# Altium footprint library UWRT Footprint Library.PcbLib: 258 footprints (part 9 of 17)
Each footprint in its own frame and in the unit in brackets; x right, y up, seen from the top. Pads: shape width x height; smd on the part's side, far side on the other; paste and mask are expansions set on the pad; w line width, h text height; cw(c..) or ccw(c..) is an arc to the next point about the centre after c.
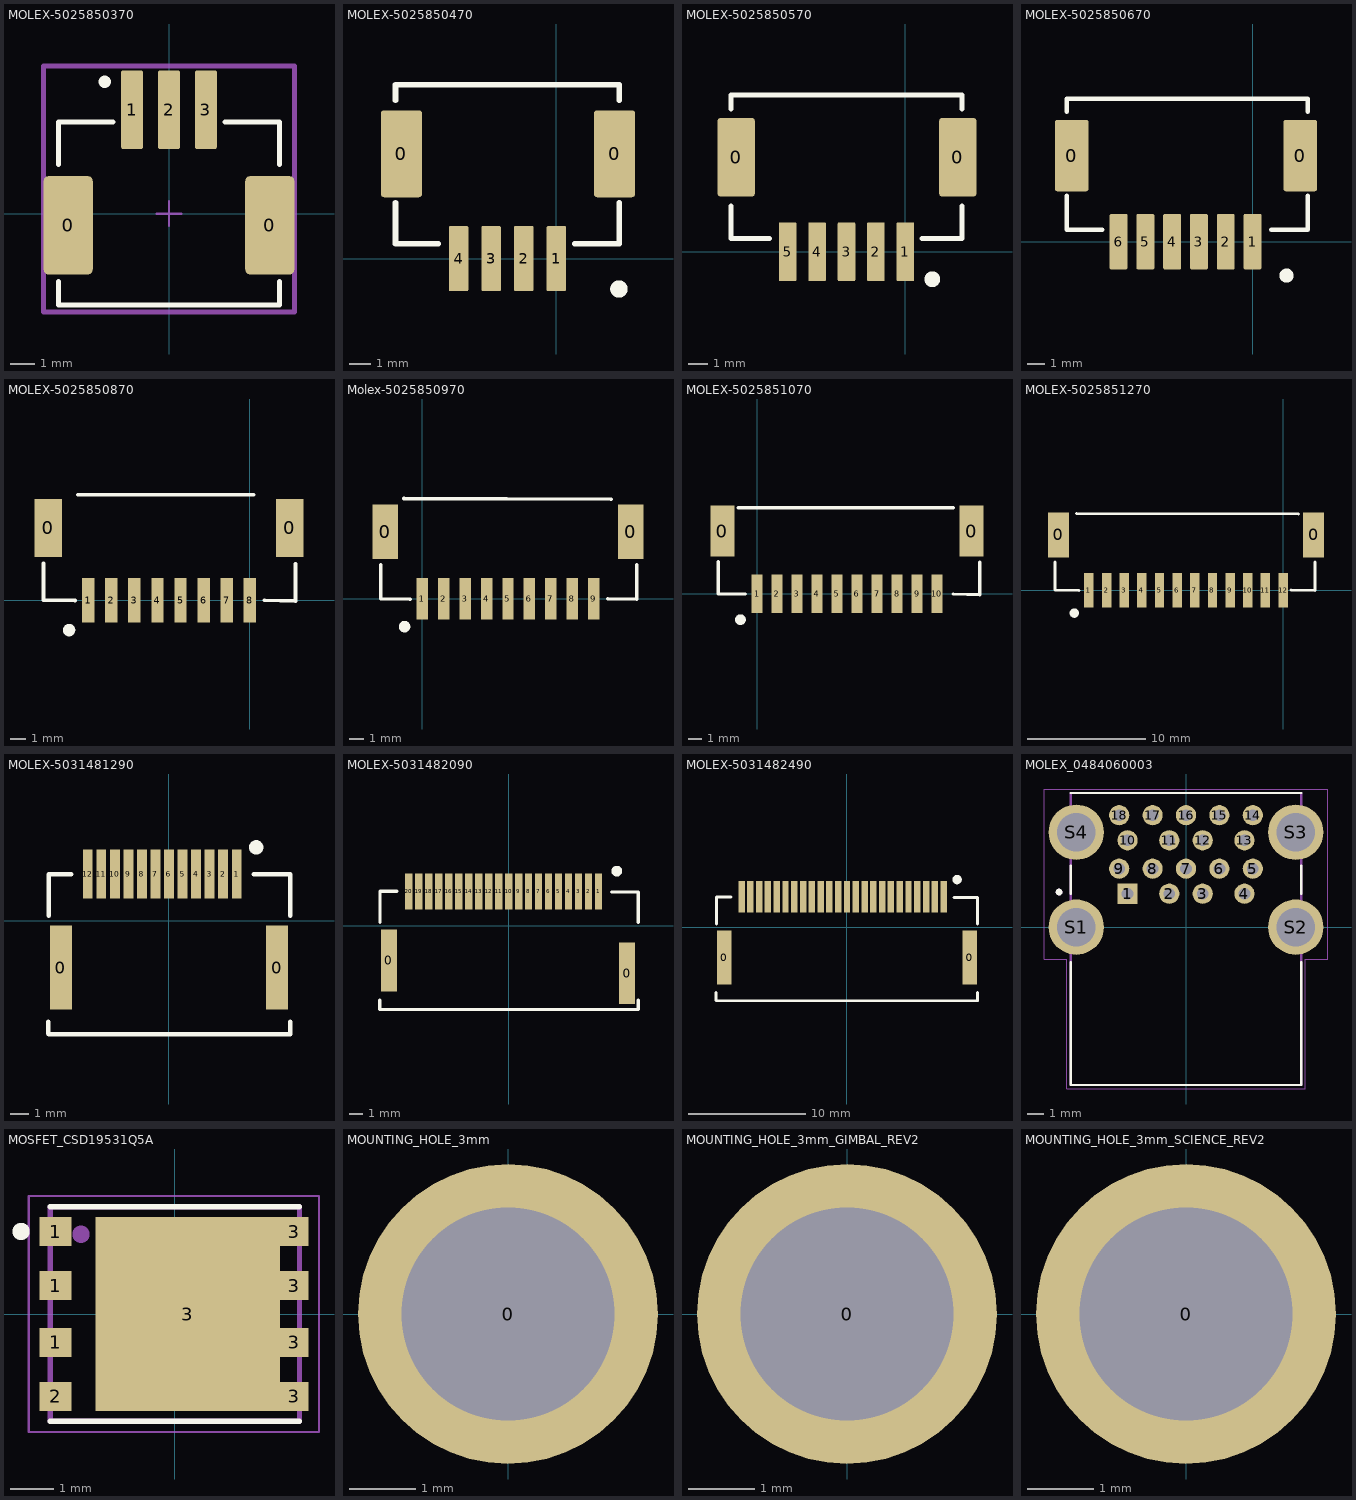
[diagram p8: the footprints below, top view; thin cyan lines are the x and y axes]

## MOLEX-5025850370 [mm]
pads (5):
  rrect20% 2x4 smd paste+0 mask+0: 0(-4.1,-0.475) 0(4.1,-0.475)
  rrect20% 0.9x3.2 smd paste+0 mask+0: 1(-1.5,4.225) 2(0,4.225) 3(1.5,4.225)
Top Overlay:
  circle w0.25: c-2.616,5.359 r0.125
  lines w0.2: -4.5,-2.75 -4.5,-3.725 4.5,-3.725 4.5,-2.75 ; -4.5,2 -4.5,3.725 -2.275,3.725 ; 2.275,3.725 4.5,3.725 4.5,2
Mechanical 12:
  lines w0.15: -4.5,-3.725 4.5,-3.725
Mechanical 15:
  lines w0.1: -0.5,0 0.5,0 ; 0,-0.5 0,0.5
  lines w0.2: -5.1,-3.825 -5.1,6 5.1,6 5.1,-3.825 ; -5.1,5.775 -5.1,-4 5.1,-4 5.1,5.775
3D body "Conn_Molex_502585-0370_eec.STEP": height 6.4, standoff 0, extent -4.4,-3.666 4.4,4.834

## MOLEX-5025850470 [mm] "CLIK-Mate, Surface Mount, Right Angle, 1.5mm pitch"
pads (6):
  rrect15% 1.9x4 smd: 0(-7.125,4.82) 0(2.675,4.82)
  rrect15% 0.9x3 smd: 1(0,0) 2(-1.5,0) 3(-3,0) 4(-4.5,0)
Top Overlay:
  circle w0.4: c2.875,-1.4 r0.2
  lines w0.254: -7.4,2.575 -7.4,0.675 -5.425,0.675 ; -7.4,7.275 -7.4,8 2.9,8 2.9,7.275 ; 0.85,0.675 2.9,0.675 2.9,2.575
3D body "5025850470.stp": height 6.41, standoff 0.01, extent -7.45,-0.62 2.85,7.88

## MOLEX-5025850570 [mm]
pads (7):
  rrect15% 1.9x4 smd: 0(-8.625,4.82) 0(2.675,4.82)
  rrect15% 0.9x3 smd: 1(0,0) 2(-1.5,0) 3(-3,0) 4(-4.5,0) 5(-6,0)
Top Overlay:
  circle w0.4: c1.375,-1.4 r0.2
  lines w0.254: -8.9,2.337 -8.9,0.675 -6.925,0.675 ; -8.9,7.275 -8.9,8 2.9,8 2.9,7.275 ; 0.85,0.675 2.9,0.675 2.9,2.337
3D body "2132260510.stp": height 6.21, standoff -0.19, extent -8.9,-0.5 2.9,8

## MOLEX-5025850670 [mm]
pads (8):
  rrect15% 1.9x4 smd: 0(-10.125,4.82) 0(2.675,4.82)
  rrect15% 1x3.1 smd: 1(0,0) 2(-1.5,0) 3(-3,0) 4(-4.5,0) 5(-6,0) 6(-7.5,0)
Top Overlay:
  circle w0.4: c1.9,-1.9 r0.2
  lines w0.254: -10.4,2.575 -10.4,0.675 -8.425,0.675 ; -10.4,7.275 -10.4,8 3.1,8 3.1,7.275 ; 1.05,0.675 3.1,0.675 3.1,2.575
3D body "5025850670.stp": height 6.41, standoff 0.01, extent -10.25,-0.62 3.05,7.88

## MOLEX-5025850870 [mm]
pads (10):
  rect 1.8x3.8 smd: 0(-13.1,4.7) 0(2.6,4.7)
  rect 0.8x2.9 smd: 1(-10.5,0) 2(-9,0) 3(-7.5,0) 4(-6,0) 5(-4.5,0) 6(-3,0) 7(-1.5,0) 8(0,0)
Top Overlay:
  circle w0.4: c-11.742,-1.94 r0.2
  lines w0.254: -13.403,2.393 -13.403,0 -11.361,-0.02 ; -11.176,6.858 0.254,6.858 ; 0.958,0 2.969,-0.045 ; 2.969,0 2.969,2.368
3D body "5025850870.stp": height 6.41, standoff 0.01, extent -13.23,-1.256 3.07,7.244

## Molex-5025850970 [mm]
pads (11):
  rect 1.8x3.8 smd: 0(-2.6,4.7) 0(14.6,4.7)
  rect 0.8x2.9 smd: 1(0,0) 2(1.5,0) 3(3,0) 4(4.5,0) 5(6,0) 6(7.5,0) 7(9,0) 8(10.5,0) 9(12,0)
Top Overlay:
  circle w0.4: c-1.242,-1.94 r0.2
  lines w0.254: -2.903,2.393 -2.903,0 -0.861,-0.02 ; -1.284,7.03 13.208,6.98 ; 12.989,0.017 15,-0.029 ; 15,0.017 15,2.384
3D body "5025850970.stp": height 5.8, standoff -0.6, extent -2.9,-1.256 14.9,7.244

## MOLEX-5025851070 [mm]
pads (12):
  rect 1.8x3.8 smd: 0(-2.6,4.7) 0(16.1,4.7)
  rect 0.8x2.9 smd: 1(0,0) 2(1.5,0) 3(3,0) 4(4.5,0) 5(6,0) 6(7.5,0) 7(9,0) 8(10.5,0) 9(12,0) 10(13.5,0)
Top Overlay:
  circle w0.4: c-1.242,-1.94 r0.2
  lines w0.254: -2.903,2.393 -2.903,0 -0.861,-0.02 ; -1.422,6.452 14.708,6.45 ; 14.708,-0.02 16.719,-0.065 ; 16.719,-0.02 16.719,2.348
3D body "5025851070.stp": height 6.26, standoff -0.14, extent -2.892,-0.948 16.408,7.552

## MOLEX-5025851270 [mm]
pads (14):
  rect 1.8x3.8 smd: 0(-19.1,4.7) 0(2.6,4.7)
  rect 0.8x2.9 smd: 1(-16.5,0) 2(-15,0) 3(-13.5,0) 4(-12,0) 5(-10.5,0) 6(-9,0) 7(-7.5,0) 8(-6,0) 9(-4.5,0) 10(-3,0) 11(-1.5,0) 12(0,0)
Top Overlay:
  circle w0.4: c-17.742,-1.94 r0.2
  lines w0.254: -19.403,2.393 -19.403,0 -17.361,-0.02 ; -17.577,6.502 1.321,6.477 ; 0.683,0.03 2.694,-0.015 ; 2.694,0.03 2.694,2.398
3D body "5025851270.stp": height 6.41, standoff 0.01, extent -19.354,-1.103 2.946,7.397

## MOLEX-5031481290 [mm] "Molex 5024940670 12 pin 1.5 mm pitch SMD RA connector"
pads (14):
  rect 1.2x4.65 smd: 0(-5.98,-2.587) 0(5.98,-2.587)
  rect 0.55x2.7 smd: 1(3.75,2.588) 2(3,2.588) 3(2.25,2.588) 4(1.5,2.588) 5(0.75,2.588) 6(0,2.588) 7(-0.75,2.588) 8(-1.5,2.588) 9(-2.25,2.588) 10(-3,2.588) 11(-3.75,2.588) 12(-4.5,2.588)
Top Overlay:
  circle w0.4: c4.826,4.064 r0.2
  lines w0.254: -6.676,-5.588 -6.676,-6.254 -6.65,-6.28 6.704,-6.28 6.704,-5.588 ; -6.65,0.28 -6.65,2.588 -5.406,2.588 ; 4.698,2.588 6.704,2.588 6.704,0.28
3D body "5031481290.stp": height 9.21, standoff 0.01, extent -6.65,-6.153 6.65,3.397

## MOLEX-5031482090 [mm] "Molex 5024940670 20 pin 1.5 mm pitch SMD RA connector"
pads (22):
  rect 1.2x4.65 smd: 0(-8.98,-2.587) 0(8.89,-3.556)
  rect 0.55x2.7 smd: 1(6.75,2.588) 2(6,2.588) 3(5.25,2.588) 4(4.5,2.588) 5(3.75,2.588) 6(3,2.588) 7(2.25,2.588) 8(1.5,2.588) 9(0.75,2.588) 10(0,2.588) 11(-0.75,2.588) 12(-1.5,2.588) 13(-2.25,2.588) 14(-3,2.588) 15(-3.75,2.588) 16(-4.5,2.588) 17(-5.25,2.588) 18(-6,2.588) 19(-6.75,2.588) 20(-7.5,2.588)
Top Overlay:
  circle w0.4: c8.121,4.112 r0.2
  lines w0.254: -9.676,-5.588 -9.676,-6.254 -9.65,-6.28 9.729,-6.28 9.729,-5.588 ; -9.65,0.28 -9.65,2.588 -8.406,2.588 ; 7.723,2.54 9.729,2.54 9.729,0.254
3D body "5031482090.stp": height 9.21, standoff 0.01, extent -9.65,-6.28 9.65,3.27

## MOLEX-5031482490 [mm] "Molex 5031482490 24 pin 1.5 mm pitch SMD RA connector"
pads (26):
  rect 1.2x4.65 smd mask+0.05: 0(-10.48,-2.588) 0(10.48,-2.588)
  rect 0.55x2.7 smd mask+0.05: 1(8.25,2.588) 2(7.5,2.588) 3(6.75,2.588) 4(6,2.588) 5(5.25,2.588) 6(4.5,2.588) 7(3.75,2.588) 8(3,2.588) 9(2.25,2.588) 10(1.5,2.588) 11(0.75,2.588) 12(0,2.588) 13(-0.75,2.588) 14(-1.5,2.588) 15(-2.25,2.588) 16(-3,2.588) 17(-3.75,2.588) 18(-4.5,2.588) 19(-5.25,2.588) 20(-6,2.588) 21(-6.75,2.588) 22(-7.5,2.588) 23(-8.25,2.588) 24(-9,2.588)
Top Overlay:
  circle w0.4: c9.398,4.064 r0.2
  lines w0.254: -11.176,-5.588 -11.176,-6.254 -11.15,-6.28 11.15,-6.28 11.15,-5.588 ; -11.15,0.28 -11.15,2.588 -9.906,2.588 ; 9.144,2.54 11.15,2.54 11.15,0.254
3D body "5031482490.stp": height 9.21, standoff 0.01, extent -11.15,-6.28 11.15,3.27

## MOLEX_0484060003 [mm]
pads (22):
  rect 1.208x1.208 hole 0.7: 1(-3.5,2)
  round 1.208 hole 0.7: 2(-1,2) 3(1,2) 4(3.5,2) 5(4,3.5) 6(2,3.5) 7(0,3.5) 8(-2,3.5) 9(-4,3.5) 10(-3.5,5.2) 11(-1,5.2) 12(1,5.2) 13(3.5,5.2) 14(4,6.7) 15(2,6.7) 16(0,6.7) 17(-2,6.7) 18(-4,6.7)
  round 3.316 hole 2.3: S1(-6.57,0) S2(6.57,0) S3(6.57,5.68) S4(-6.57,5.68)
Top Overlay:
  circle w0.2: c-7.6,2.1 r0.1
  lines w0.127: -6.9,-2.1 -6.9,-9.44 6.9,-9.44 6.9,-2.1 ; -6.9,2 -6.9,3.7 ; -6.9,8.02 6.9,8.02 ; 6.9,2 6.9,3.7
Mechanical 13:
  circle w0.2: c-7.6,2.1 r0.1
  lines w0.127: -6.9,-9.44 -6.9,8.02 6.9,8.02 6.9,-9.44 -6.9,-9.44
Mechanical 15:
  lines w0.05: -8.5,-1.92 -7.15,-1.92 -7.15,-9.69 7.15,-9.69 7.15,-1.92 8.5,-1.92 8.5,8.27 -8.5,8.27 -8.5,-1.92
3D body "484060003.stp": height 16.2, standoff -3.2, extent -7.874,-9.492 7.796,7.968

## MOSFET_CSD19531Q5A [mm]
pads (9):
  rect 0.75x0.675 smd paste-1: 1(-2.776,-0.66) 1(-2.776,0.66) 1(-2.776,1.917) 2(-2.776,-1.917)
  rect 4.295x4.51 smd paste-3: 3(0.301,0)
  rect 0.655x0.675 smd paste-1: 3(2.776,-1.917) 3(2.776,-0.66) 3(2.776,0.66) 3(2.776,1.917)
Top Overlay:
  circle w0.3: c-3.578,1.921 r0.05
  lines w0.127: -2.9,-2.5 2.9,-2.5 ; -2.9,2.5 2.9,2.5
Top Paste:
  region: -0.174,0.31 -1.409,0.31 -1.409,1.88 -0.174,1.88
  region: 1.911,0.31 0.327,0.31 0.327,1.88 1.911,1.88
  region: -0.174,-1.883 -1.411,-1.883 -1.411,-0.31 -0.174,-0.31
  region: 1.911,-1.882 0.327,-1.882 0.327,-0.31 1.911,-0.31
  region: 3.026,1.668 2.527,1.668 2.527,2.167 3.026,2.167
  region: 3.026,0.41 2.528,0.41 2.528,0.91 3.026,0.91
  region: 3.026,-0.91 2.528,-0.91 2.528,-0.41 3.026,-0.41
  region: 3.026,-2.172 2.531,-2.172 2.531,-1.667 3.026,-1.667
  region: -2.526,1.67 -3.03,1.67 -3.03,2.167 -2.526,2.167
  region: -2.526,0.41 -3.027,0.41 -3.027,0.91 -2.526,0.91
  region: -2.526,-0.91 -3.026,-0.91 -3.026,-0.41 -2.526,-0.41
  region: -2.526,-2.171 -3.031,-2.171 -3.031,-1.667 -2.526,-1.667
Mechanical 13:
  circle w0.3: c-2.186,1.855 r0.05
  lines w0.127: -2.9,-2.5 -2.9,2.5 2.9,2.5 2.9,-2.5 -2.9,-2.5
Mechanical 15:
  lines w0.05: -3.401,-2.75 -3.401,2.75 3.354,2.75 3.354,-2.75 -3.401,-2.75
3D body "CSD17577Q5AT.STEP": height 1.1, standoff 0, extent -3,-2.45 3,2.45

## MOUNTING_HOLE_3mm [mm] "3mm Hole"
pads (1):
  round 4.5 hole 3.2 mask+0.3: 0(0,0)

## MOUNTING_HOLE_3mm_GIMBAL_REV2 [mm] "3mm Hole"
pads (1):
  round 4.5 / inner round 4.5 / far side round 5.25 hole 3.2 mask+0.3: 0(0,0)

## MOUNTING_HOLE_3mm_SCIENCE_REV2 [mm] "3mm Hole"
pads (1):
  round 4.5 / inner round 4.5 / far side round 6 hole 3.2 mask+0.3: 0(0,0)